# Altium schematic symbol library FPGA_Xilinx_Virtex7.SchLib: 34 symbols (part 24 of 26) (continued)
## XC7VX1140T-FLG1926 (continued)
part O pins: AA39 MGTHRXP0_215, AA40 MGTHRXN0_215, AA43 MGTHTXP1_215, AA44 MGTHTXN1_215, AB37 MGTREFCLK1P_215, AB38 MGTREFCLK1N_215, AB41 MGTHTXP0_215, AB42 MGTHTXN0_215, M41 MGTHRXP3_216, M42 MGTHRXN3_216, N39 MGTHRXP2_216, N40 MGTHRXN2_216, N43 MGTHTXP3_216, N44 MGTHTXN3_216, P37 MGTREFCLK0P_216, P38 MGTREFCLK0N_216, P41 MGTHTXP2_216, P42 MGTHTXN2_216, R39 MGTHRXP1_216, R40 MGTHRXN1_216, R43 MGTHTXP1_216, R44 MGTHTXN1_216, T37 MGTREFCLK1P_216, T38 MGTREFCLK1N_216, T41 MGTHRXP0_216, T42 MGTHRXN0_216, U39 MGTHRXP3_215, U40 MGTHRXN3_215, U43 MGTHTXP0_216, U44 MGTHTXN0_216, V37 MGTREFCLK0P_215, V38 MGTREFCLK0N_215, V41 MGTHTXP3_215, V42 MGTHTXN3_215, W39 MGTHRXP2_215, W40 MGTHRXN2_215, W43 MGTHTXP2_215, W44 MGTHTXN2_215, Y41 MGTHRXP1_215, Y42 MGTHRXN1_215
part P pins: A39 MGTHRXP3_218, A40 MGTHRXN3_218, B41 MGTHTXP3_218, B42 MGTHTXN3_218, C39 MGTHRXP2_218, C40 MGTHRXN2_218, C43 MGTHTXP2_218, C44 MGTHTXN2_218, D37 MGTREFCLK0P_218, D38 MGTREFCLK0N_218, D41 MGTHRXP1_218, D42 MGTHRXN1_218, E39 MGTHRXP0_218, E40 MGTHRXN0_218, E43 MGTHTXP1_218, E44 MGTHTXN1_218, F37 MGTREFCLK1P_218, F38 MGTREFCLK1N_218, F41 MGTHTXP0_218, F42 MGTHTXN0_218, G39 MGTHRXP3_217, G40 MGTHRXN3_217, G43 MGTHTXP3_217, G44 MGTHTXN3_217, H41 MGTHRXP2_217, H42 MGTHRXN2_217, J39 MGTHRXP1_217, J40 MGTHRXN1_217, J43 MGTHTXP2_217, J44 MGTHTXN2_217, K37 MGTREFCLK0P_217, K38 MGTREFCLK0N_217, K41 MGTHTXP1_217, K42 MGTHTXN1_217, L39 MGTHRXP0_217, L40 MGTHRXN0_217, L43 MGTHTXP0_217, L44 MGTHTXN0_217, M37 MGTREFCLK1P_217, M38 MGTREFCLK1N_217
part Q pins: AA8 MGTAVCC_G11, AA37 MGTAVCC_G21, AB6 MGTAVCC_G11, AB39 MGTAVCC_G21, AC4 MGTAVTT_G11, AC41 MGTAVTT_G21, AD2 MGTAVTT_G11, AD43 MGTAVTT_G21, AE8 MGTAVCC_G11, AE37 MGTAVCC_G21, AF6 MGTAVCC_G11, AF39 MGTAVCC_G21, AG4 MGTAVTT_G11, AG41 MGTAVTT_G21, AH2 MGTAVTT_G11, AH43 MGTAVTT_G21, AJ8 MGTAVCC_G11, AJ37 MGTAVCC_G21, AK6 MGTAVCC_G11, AK39 MGTAVCC_G21, AL4 MGTAVTT_G11, AL41 MGTAVTT_G21, AM2 MGTAVTT_G11, AM7 MGTAVTTRCAL_112, AM8 MGTRREF_112, AM37 MGTRREF_212, AM38 MGTAVTTRCAL_212, AM43 MGTAVTT_G21, AN8 MGTVCCAUX_G10, AN37 MGTVCCAUX_G20, AP6 MGTAVCC_G10, AP39 MGTAVCC_G20, AR4 MGTAVTT_G10, AR8 MGTAVCC_G10, AR37 MGTAVCC_G20, AR41 MGTAVTT_G20, AT2 MGTAVTT_G10, AT43 MGTAVTT_G20, AV6 MGTAVCC_G10, AV39 MGTAVCC_G20, AW4 MGTAVTT_G10, AW8 MGTAVCC_G10, AW37 MGTAVCC_G20, AW41 MGTAVTT_G20, AY2 MGTAVTT_G10, AY43 MGTAVTT_G20, B6 MGTAVCC_G12, B39 MGTAVCC_G22, BB6 MGTAVCC_G10, BB39 MGTAVCC_G20, BC4 MGTAVTT_G10, BC41 MGTAVTT_G20, C4 MGTAVTT_G12, C41 MGTAVTT_G22, D2 MGTAVTT_G12, D43 MGTAVTT_G22, E8 MGTAVCC_G12, E37 MGTAVCC_G22, F6 MGTAVCC_G12, F39 MGTAVCC_G22, G4 MGTAVTT_G12, G41 MGTAVTT_G22, H2 MGTAVTT_G12, H7 MGTAVTTRCAL_118, H8 MGTRREF_118, H37 MGTRREF_218, H38 MGTAVTTRCAL_218, H43 MGTAVTT_G22, J8 MGTAVCC_G12, J37 MGTAVCC_G22, K6 MGTAVCC_G12, K39 MGTAVCC_G22, L4 MGTAVTT_G12, L41 MGTAVTT_G22, M2 MGTAVTT_G12, M43 MGTAVTT_G22, N8 MGTAVCC_G12, N37 MGTAVCC_G22, P6 MGTAVCC_G12, P39 MGTAVCC_G22, R4 MGTAVTT_G12, R41 MGTAVTT_G22, T2 MGTAVTT_G12, T43 MGTAVTT_G22, U8 MGTVCCAUX_G12, U37 MGTVCCAUX_G22, V6 MGTAVCC_G11, V39 MGTAVCC_G21, W4 MGTAVTT_G11, W8 MGTVCCAUX_G11, W37 MGTVCCAUX_G21, W41 MGTAVTT_G21, Y2 MGTAVTT_G11, Y7 MGTAVTTRCAL_115, Y8 MGTRREF_115, Y37 MGTRREF_215, Y38 MGTAVTTRCAL_215, Y43 MGTAVTT_G21
part R pins: AA10 CFGBVS_0, AA35 TDO_0, AB11 M1_0, AB22 VREFN_0, AB23 VP_0, AC10 M0_0, AC22 VN_0, AC23 VREFP_0, AC35 TCK_0, AD11 M2_0, AD22 DXN_0, AD23 DXP_0, AD35 VCCO_0, AE10 DONE_0, AE35 TDI_0, AF35 VCCO_0, AG35 TMS_0, W10 INIT_B_0, W35 CCLK_0, Y11 PROGRAM_B_0
part S pins: A3 GND, A4 GND, A7 GND, A12 GND, A22 GND, A32 GND, A38 GND, A41 GND, A42 GND, AA11 VCCINT, AA13 VCCINT, AA15 VCCINT, AA17 VCCAUX, AA19 VCCINT, AA21 VCCINT, AA22 GNDADC, AA23 VCCADC, AA25 VCCAUX_IO_G1, AA27 VCCAUX, AA29 VCCINT, AA31 VCCINT, AA33 VCCINT, AB12 VCCINT, AB14 VCCINT, AB16 VCCINT, AB18 VCCAUX_IO_G4, AB20 VCCINT, AB24 VCCBRAM, AB26 VCCAUX_IO_G1, AB28 VCCINT, AB30 VCCINT, AB32 VCCINT, AB34 VCCINT, AC11 VCCINT, AC13 VCCINT, AC15 VCCINT, AC17 VCCAUX, AC19 VCCINT, AC21 VCCINT, AC25 VCCAUX_IO_G1, AC27 VCCAUX, AC29 VCCINT, AC31 VCCINT, AC33 VCCINT, AD12 VCCINT, AD14 VCCINT, AD16 VCCINT, AD18 VCCAUX_IO_G4, AD20 VCCINT, AD24 VCCBRAM, AD26 VCCAUX_IO_G0, AD28 VCCINT, AD30 VCCINT, AD32 VCCINT, AD34 VCCINT, AE11 VCCINT, AE13 VCCINT, AE15 VCCINT, AE17 VCCAUX, AE19 VCCAUX_IO_G3, AE21 VCCINT, AE23 VCCBRAM, AE25 VCCAUX_IO_G0, AE27 VCCAUX, AE29 VCCINT, AE31 VCCINT, AE33 VCCINT, AF12 VCCINT, AF14 VCCINT, AF16 VCCINT, AF18 VCCAUX_IO_G3, AF20 VCCINT, AF22 VCCINT, AF24 VCCBRAM, AF26 VCCAUX_IO_G0, AF28 VCCINT, AF30 VCCINT, AF32 VCCINT, AF34 VCCINT, AG11 VCCINT, AG13 VCCINT, AG15 VCCINT, AG17 VCCAUX, AG19 VCCAUX_IO_G3, AG21 VCCINT, AG23 VCCINT, AG25 VCCBRAM, AG27 VCCAUX, AG29 VCCINT, AG31 VCCINT, AG33 VCCINT, AH14 VCCINT, AH20 VCCINT, AH22 VCCINT, AH24 VCCBRAM, AH32 VCCINT, AH34 VCCINT, B2 GND, B5 GND, B7 GND, B9 GND, B19 GND, B29 GND, B38 GND, B40 GND, B43 GND, C3 GND, C7 GND, C8 GND, C9 GND, C16 GND, C26 GND, C36 GND, C37 GND, C38 GND, C42 GND, D1 GND, D5 GND, D6 GND, D9 GND, D13 GND, D23 GND, D33 GND, D36 GND, D39 GND, D40 GND, D44 GND, E3 GND, E4 GND, E7 GND, E9 GND, E10 GND, E20 GND, E30 GND, E36 GND, E38 GND, E41 GND, E42 GND, F1 GND, F2 GND, F5 GND, F9 GND, F17 GND, F27 GND, F36 GND, F40 GND, F43 GND, F44 GND, G3 GND, G7 GND, G8 GND, G9 GND, G14 GND, G24 GND, G34 GND, G36 GND, G37 GND, G38 GND, G42 GND, H1 GND, H5 GND, H6 GND, H9 GND, H11 GND, H21 GND, H31 GND, H36 GND, H39 GND, H40 GND, H44 GND, J3 GND, J4 GND, J7 GND, J9 GND, J18 GND, J28 GND, J36 GND, J38 GND, J41 GND, J42 GND, K1 GND, K2 GND, K5 GND, K9 GND, K15 GND, K25 GND, K35 GND, K36 GND, U35 VCCBATT_0, V12 VCCINT, V14 VCCINT, V24 VCCBRAM, V26 VCCAUX_IO_G2, V34 VCCINT, W11 VCCINT, W13 VCCINT, W15 VCCINT, W17 VCCAUX, W19 VCCAUX_IO_G5, W21 VCCINT, W23 VCCBRAM, W25 VCCBRAM, W27 VCCAUX, W29 VCCINT, W31 VCCINT, W33 VCCINT, Y12 VCCINT, Y14 VCCINT, Y16 VCCINT, Y18 VCCAUX_IO_G4, Y20 VCCINT, Y22 VCCINT, Y24 VCCBRAM, Y26 VCCAUX_IO_G2, Y28 VCCINT, Y30 VCCINT, Y32 VCCINT, Y34 VCCINT
part T pins: AA3 GND, AA4 GND, AA7 GND, AA9 GND, AA12 GND, AA14 GND, AA16 GND, AA18 GND, AA20 GND, AA24 GND, AA26 GND, AA28 GND, AA30 GND, AA32 GND, AA34 GND, AA36 GND, AA38 GND, AA41 GND, AA42 GND, AB1 GND, AB2 GND, AB5 GND, AB9 GND, AB10 GND, AB13 GND, AB15 GND, AB17 GND, AB19 GND, AB21 GND, AB25 GND, AB27 GND, AB29 GND, AB31 GND, AB33 GND, AB35 GND, AB36 GND, AB40 GND, AB43 GND, AB44 GND, AC3 GND, AC7 GND, AC8 GND, AC9 GND, AC12 GND, AC14 GND, AC16 GND, AC18 GND, AC20 GND, AC24 GND, AC26 GND, AC28 GND, AC30 GND, AC32 GND, AC34 GND, AC36 GND, AC37 GND, AC38 GND, AC42 GND, AD1 GND, AD5 GND, AD6 GND, AD9 GND, AD10 GND, AD13 GND, AD15 GND, AD17 GND, AD19 GND, AD21 GND, AD25 GND, AD27 GND, AD29 GND, AD31 GND, AD33 GND, AD36 GND, AD39 GND, AD40 GND, AD44 GND, AE3 GND, AE4 GND, AE7 GND, AE9 GND, AE12 GND, AE14 GND, AE16 GND, AE18 GND, AE20 GND, AE22 GND, AE24 GND, AE26 GND, AE28 GND, AE30 GND, AE32 GND, AE34 GND, AE36 GND, AE38 GND, AE41 GND, AE42 GND, AF1 GND, AF2 GND, AF5 GND, AF9 GND, AF10 GND, AF11 GND, AF13 GND, AF15 GND, AF17 GND, AF19 GND, AF21 GND, AF23 GND, AF25 GND, AF27 GND, AF29 GND, AF31 GND, AF33 GND, AF36 GND, AF40 GND, AF43 GND, AF44 GND, AG3 GND, AG7 GND, AG8 GND, AG9 GND, AG10 GND, AG12 GND, AG14 GND, AG16 GND, AG18 GND, AG20 GND, AG22 GND, AG24 GND, AG26 GND, AG28 GND, AG30 GND, AG32 GND, AG34 GND, AG36 GND, AG37 GND, AG38 GND, AG42 GND, AH1 GND, AH5 GND, AH6 GND, AH9 GND, AH11 GND, AH13 GND, AH15 GND, AH19 GND, AH21 GND, AH23 GND, AH25 GND, AH31 GND, AH33 GND, AH35 GND, AH36 GND, AH39 GND, AH40 GND, AH44 GND, AJ3 GND, AJ4 GND, AJ7 GND, AJ9 GND, AJ18 GND, AJ28 GND, AJ36 GND, AJ38 GND, AJ41 GND, AJ42 GND, AK1 GND, AK2 GND, K40 GND, K43 GND, K44 GND, L3 GND, L7 GND, L8 GND, L9 GND, L12 GND, L22 GND, L32 GND, L36 GND, L37 GND, L38 GND, L42 GND, M1 GND, M5 GND, M6 GND, M9 GND, M19 GND, M29 GND, M36 GND, M39 GND, M40 GND, M44 GND, N3 GND, N4 GND, N7 GND, N9 GND, N16 GND, N26 GND, N36 GND, N38 GND, N41 GND, N42 GND, P1 GND, P2 GND, P5 GND, P9 GND, P13 GND, P23 GND, P33 GND, P36 GND, P40 GND, P43 GND, P44 GND, R3 GND, R7 GND, R8 GND, R9 GND, R10 GND, R20 GND, R30 GND, R36 GND, R37 GND, R38 GND, R42 GND, T1 GND, T5 GND, T6 GND, T9 GND, T17 GND, T27 GND, T34 GND, T35 GND, T36 GND, T39 GND, T40 GND, T44 GND, U3 GND, U4 GND, U7 GND, U9 GND, U14 GND, U24 GND, U34 GND, U36 GND, U38 GND, U41 GND, U42 GND, V1 GND, V2 GND, V5 GND, V9 GND, V10 GND, V11 GND, V21 GND, V23 GND, V25 GND, V31 GND, V35 GND, V36 GND, V40 GND, V43 GND, V44 GND, W3 GND, W7 GND, W9 GND, W12 GND, W14 GND, W16 GND, W18 GND, W20 GND, W22 GND, W24 GND, W26 GND, W28 GND, W30 GND, W32 GND, W34 GND, W36 GND, W38 GND, W42 GND, Y1 GND, Y5 GND, Y6 GND, Y9 GND, Y10 GND, Y13 GND, Y15 GND, Y17 GND, Y19 GND, Y21 GND, Y23 GND, Y25 GND, Y27 GND, Y29 GND, Y31 GND, Y33 GND, Y35 GND, Y36 GND, Y39 GND, Y40 GND, Y44 GND
part U pins: AK5 GND, AK9 GND, AK15 GND, AK25 GND, AK35 GND, AK36 GND, AK40 GND, AK43 GND, AK44 GND, AL3 GND, AL7 GND, AL8 GND, AL9 GND, AL12 GND, AL22 GND, AL32 GND, AL36 GND, AL37 GND, AL38 GND, AL42 GND, AM1 GND, AM5 GND, AM6 GND, AM9 GND, AM19 GND, AM29 GND, AM36 GND, AM39 GND, AM40 GND, AM44 GND, AN3 GND, AN4 GND, AN7 GND, AN9 GND, AN16 GND, AN26 GND, AN36 GND, AN38 GND, AN41 GND, AN42 GND, AP1 GND, AP2 GND, AP5 GND, AP9 GND, AP13 GND, AP23 GND, AP33 GND, AP36 GND, AP40 GND, AP43 GND, AP44 GND, AR3 GND, AR7 GND, AR9 GND, AR10 GND, AR20 GND, AR30 GND, AR36 GND, AR38 GND, AR42 GND, AT1 GND, AT5 GND, AT6 GND, AT9 GND, AT17 GND, AT27 GND, AT36 GND, AT39 GND, AT40 GND, AT44 GND, AU3 GND, AU4 GND, AU7 GND, AU8 GND, AU9 GND, AU14 GND, AU24 GND, AU34 GND, AU36 GND, AU37 GND, AU38 GND, AU41 GND, AU42 GND, AV1 GND, AV2 GND, AV5 GND, AV9 GND, AV11 GND, AV21 GND, AV31 GND, AV36 GND, AV40 GND, AV43 GND, AV44 GND, AW3 GND, AW7 GND, AW9 GND, AW18 GND, AW28 GND, AW36 GND, AW38 GND, AW42 GND, AY1 GND, AY5 GND, AY6 GND, AY9 GND, AY15 GND, AY25 GND, AY35 GND, AY36 GND, AY39 GND, AY40 GND, AY44 GND, BA3 GND, BA4 GND, BA7 GND, BA8 GND, BA9 GND, BA12 GND, BA22 GND, BA32 GND, BA36 GND, BA37 GND, BA38 GND, BA41 GND, BA42 GND, BB1 GND, BB2 GND, BB5 GND, BB7 GND, BB9 GND, BB19 GND, BB29 GND, BB38 GND, BB40 GND, BB43 GND, BB44 GND, BC2 GND, BC3 GND, BC7 GND, BC16 GND, BC26 GND, BC36 GND, BC38 GND, BC42 GND, BC43 GND, BD5 GND, BD6 GND, BD7 GND, BD13 GND, BD23 GND, BD33 GND, BD38 GND, BD39 GND, BD40 GND

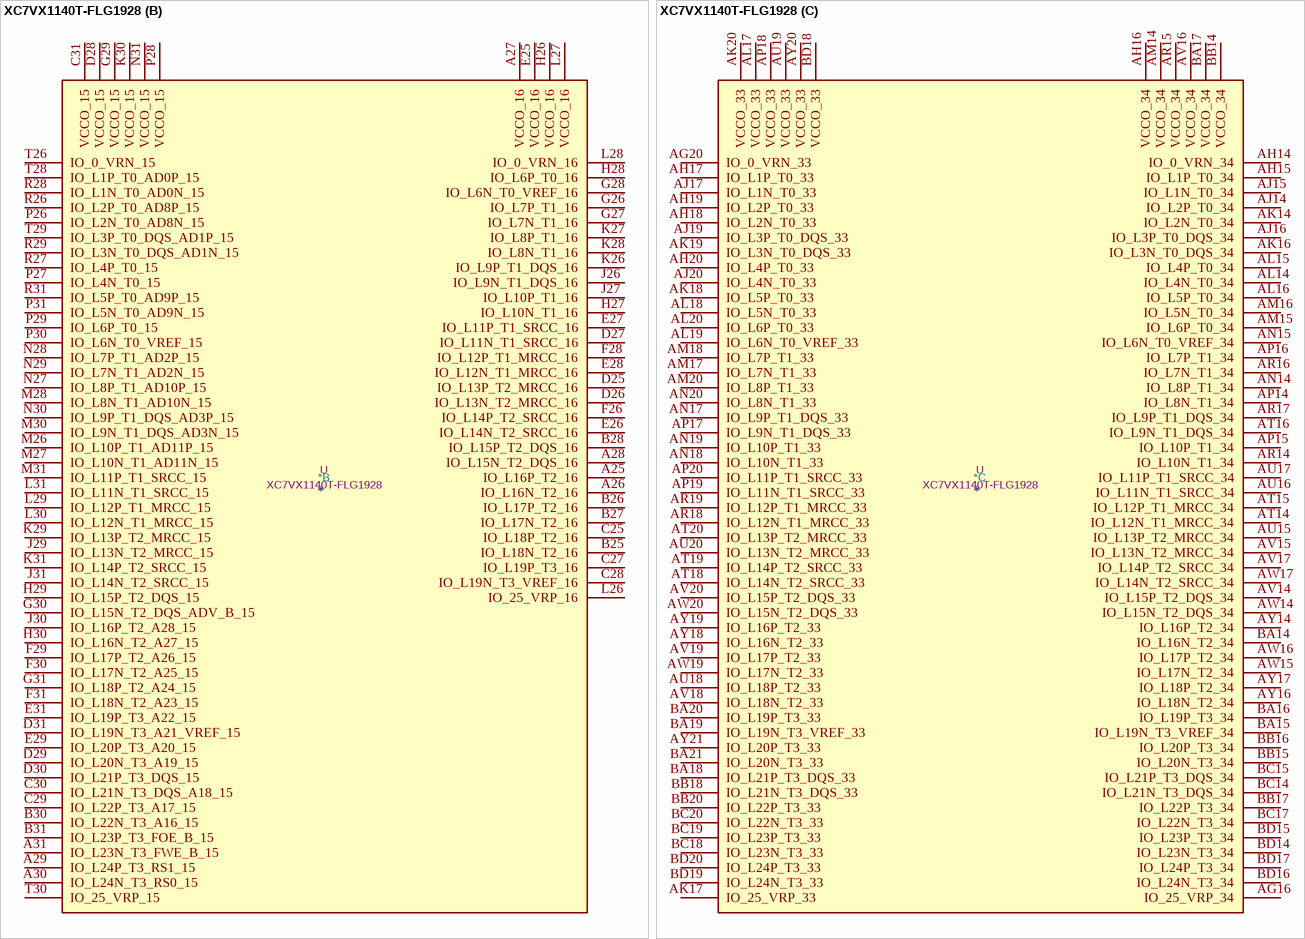
[diagram p162: symbol XC7VX1140T-FLG1928]

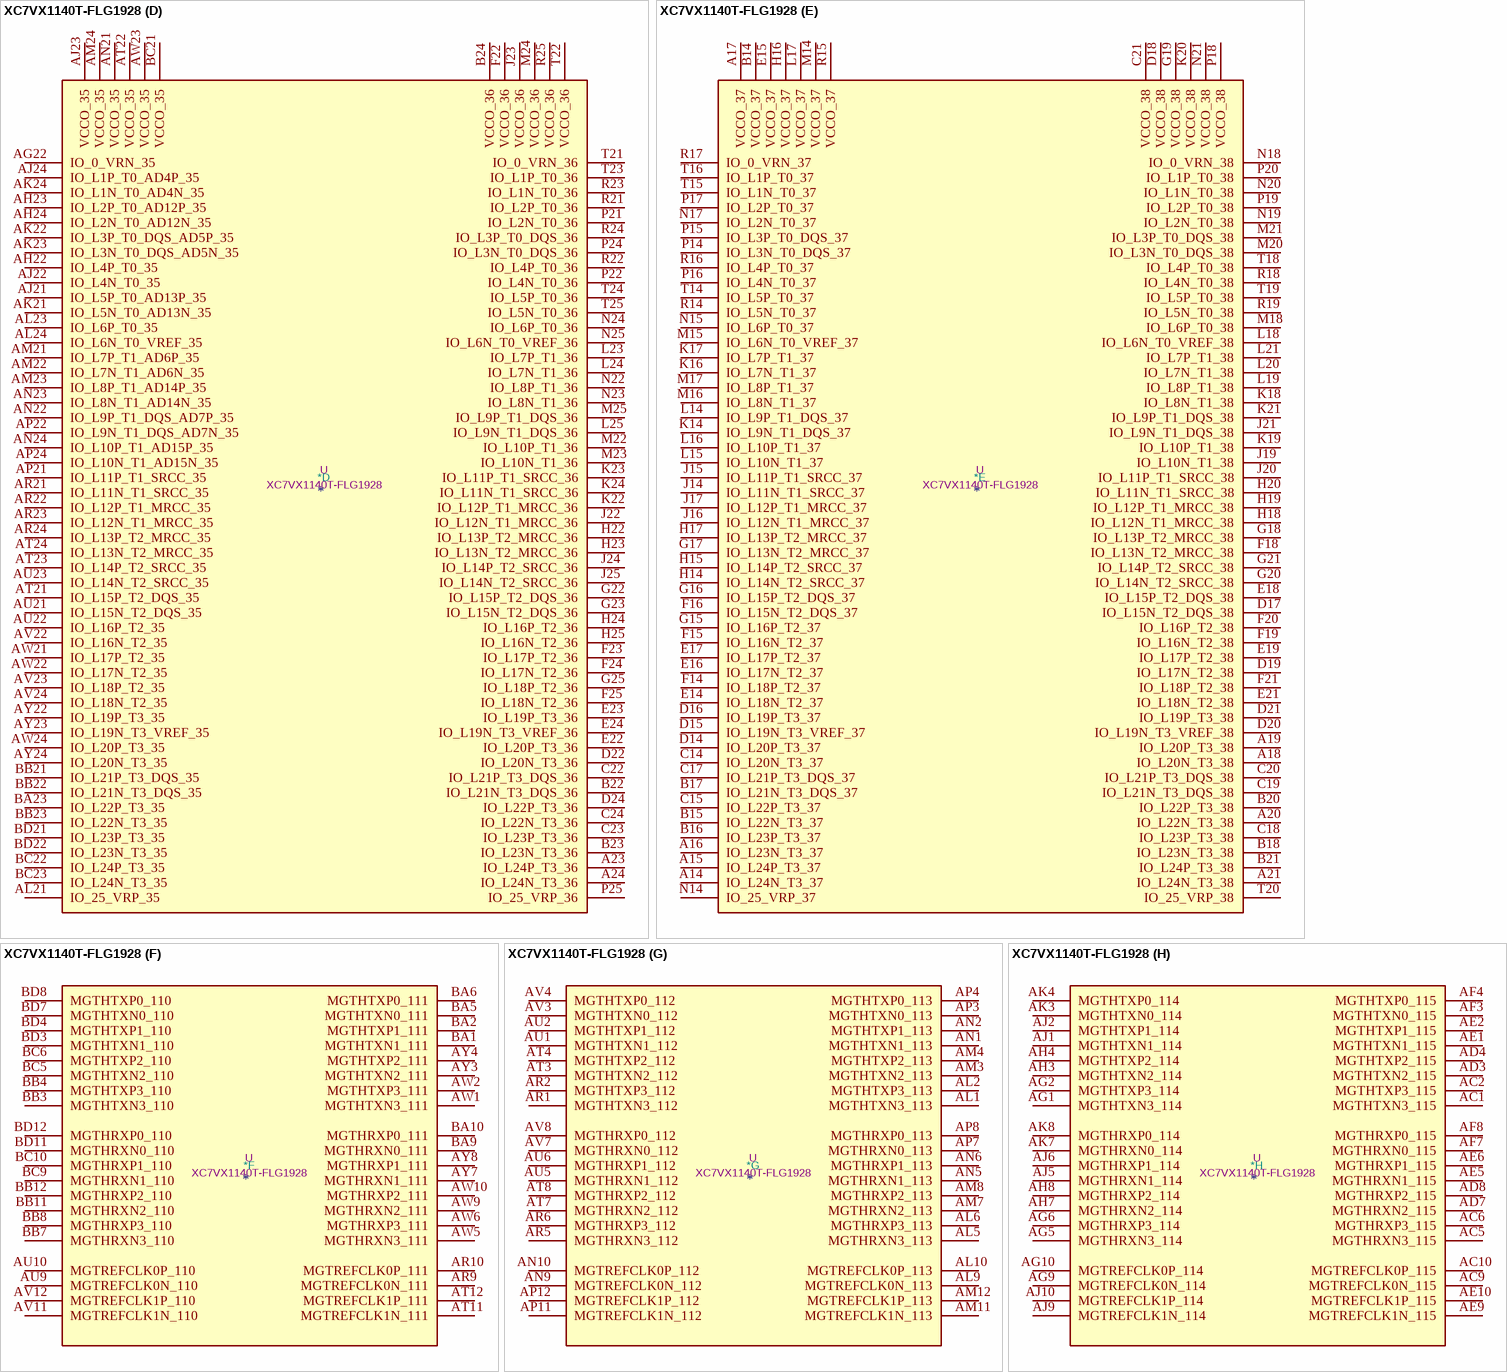
[diagram p163: symbol XC7VX1140T-FLG1928]

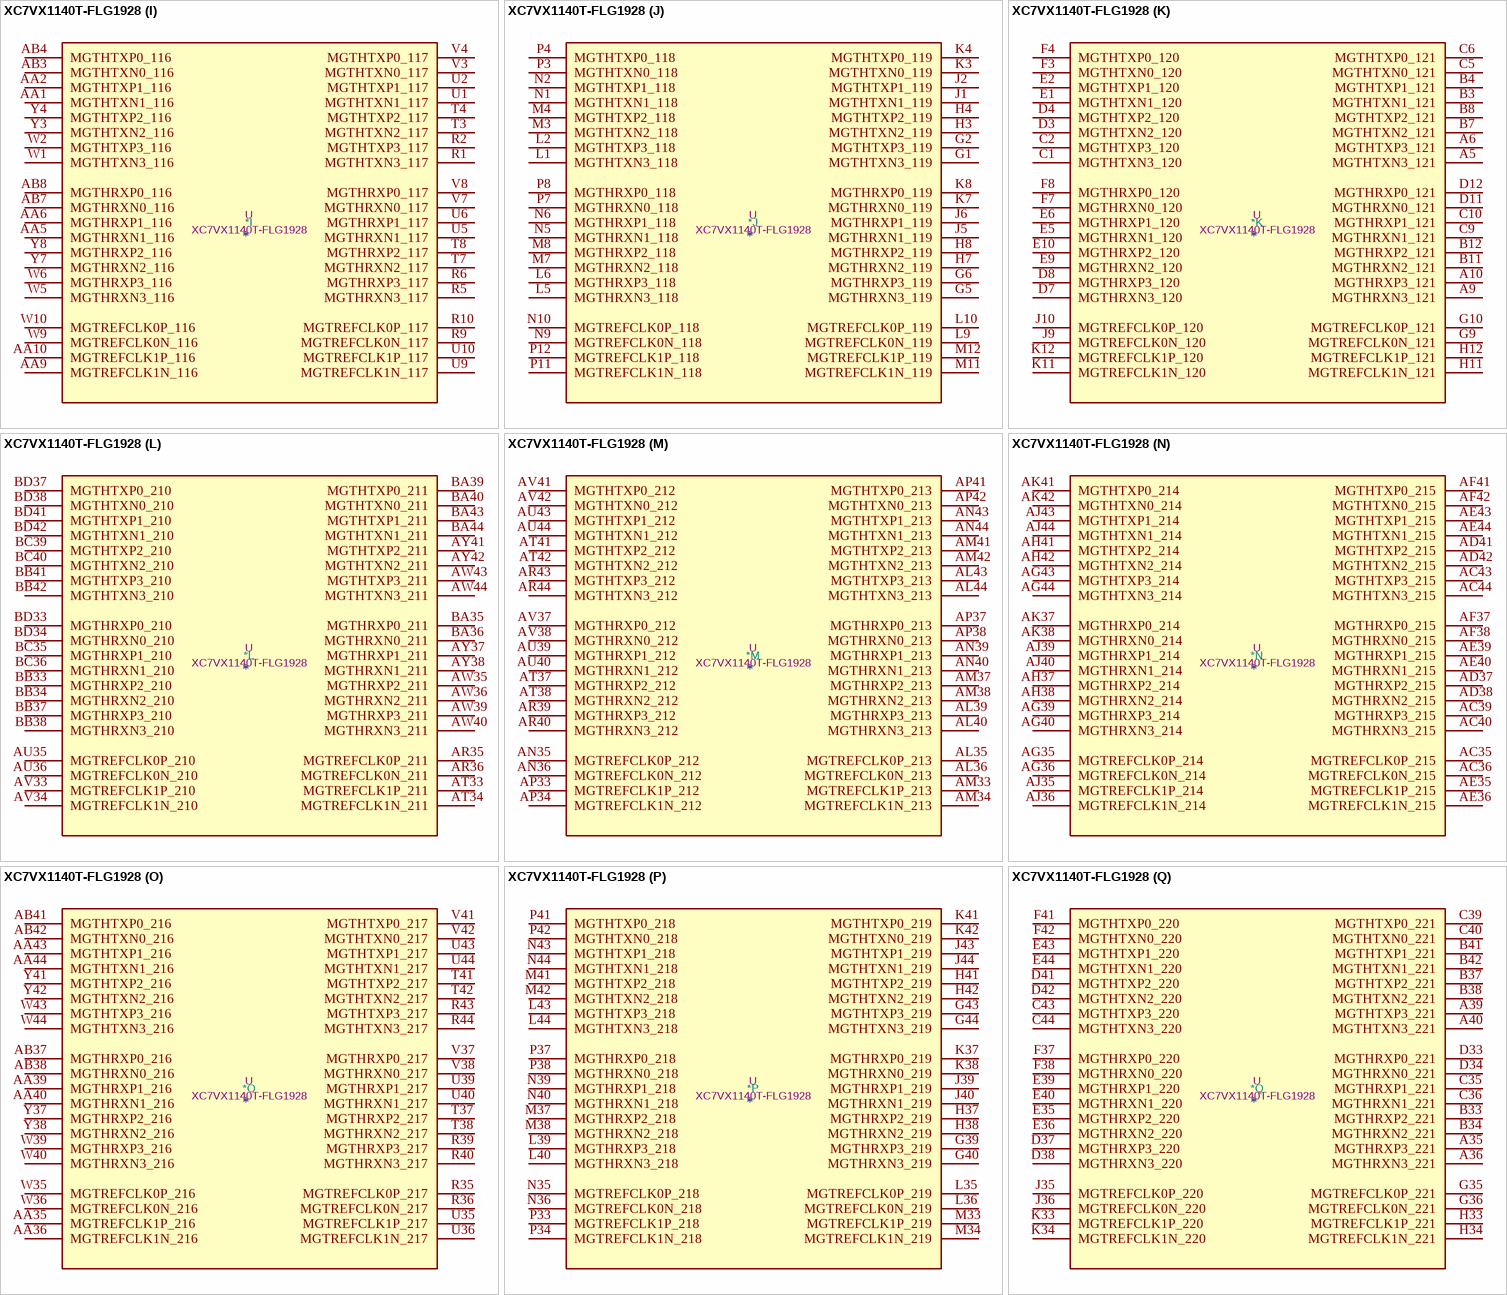
[diagram p164: symbol XC7VX1140T-FLG1928]

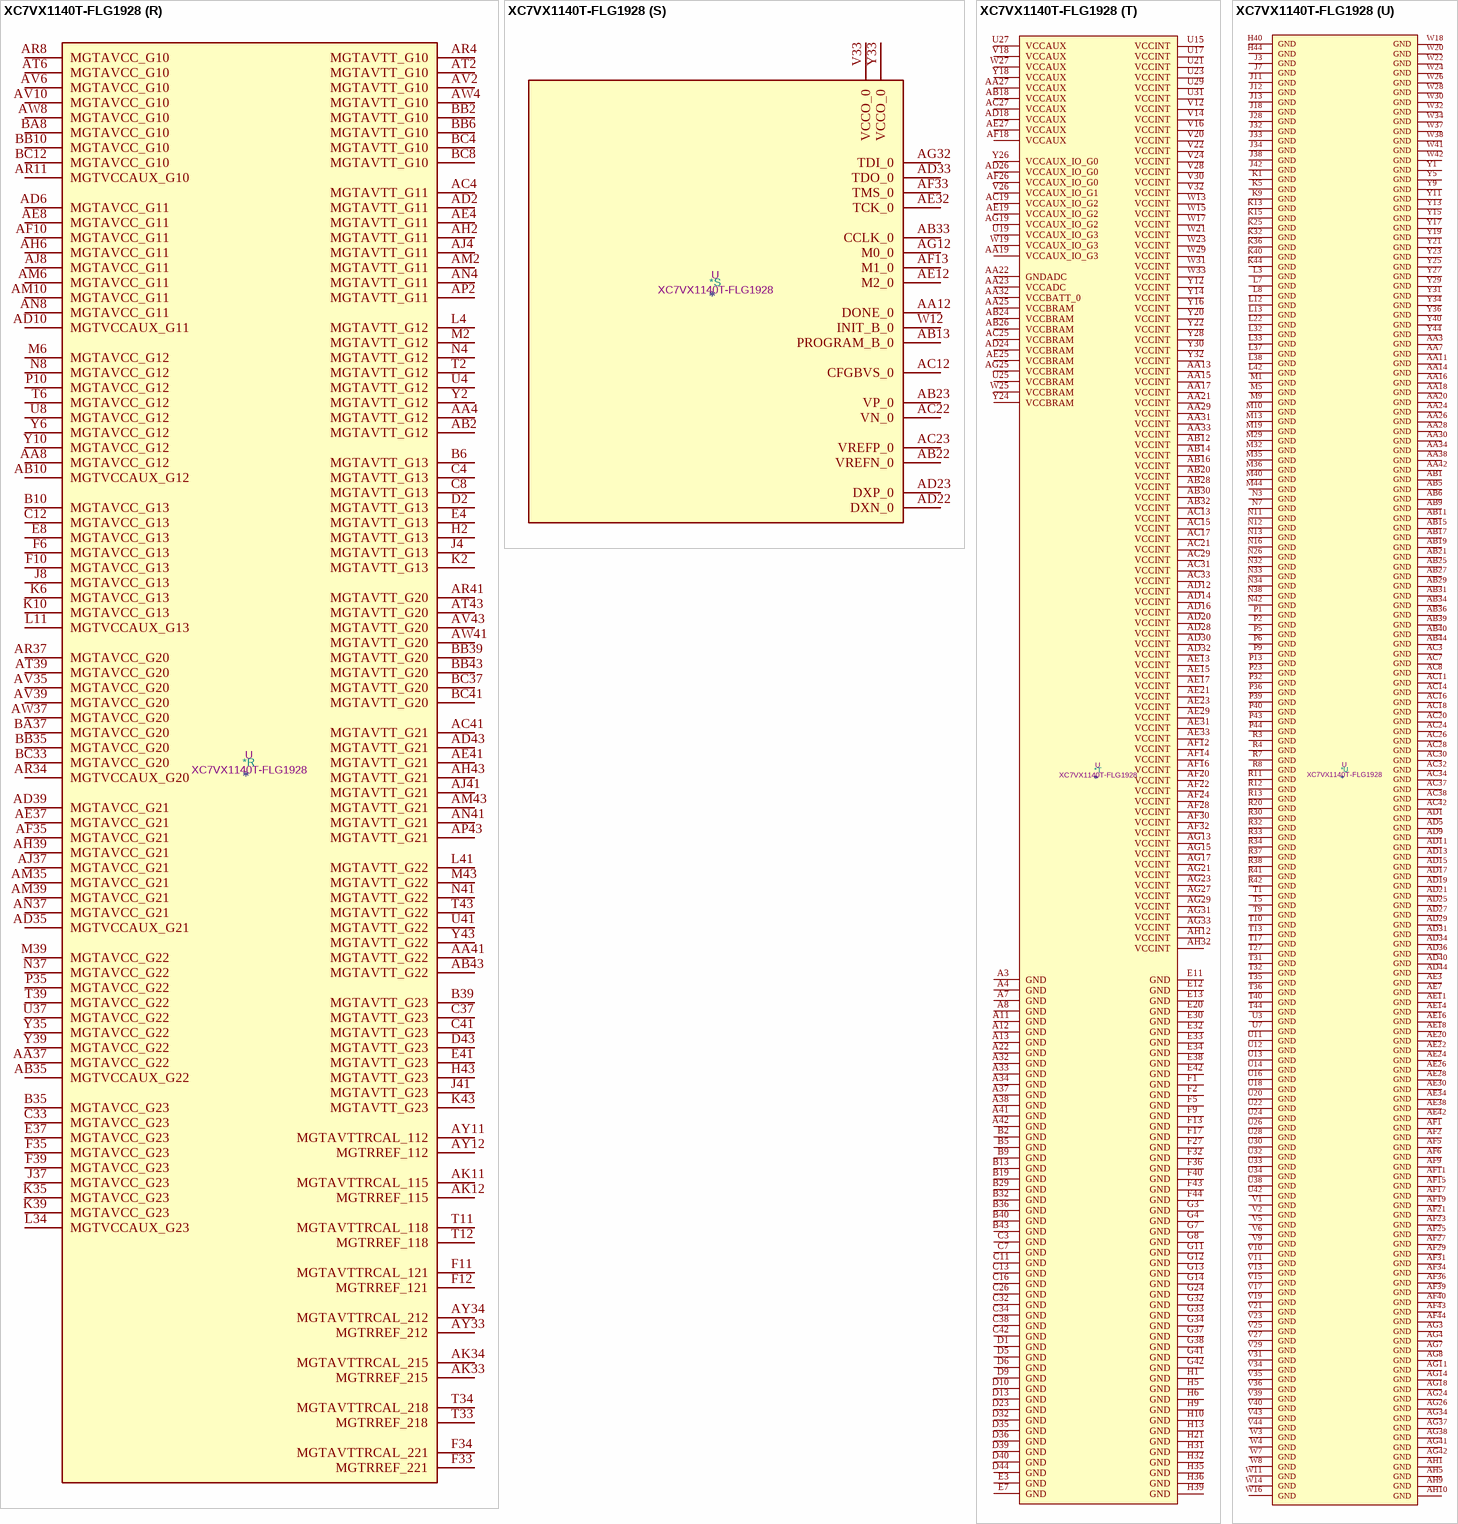
[diagram p165: symbol XC7VX1140T-FLG1928]

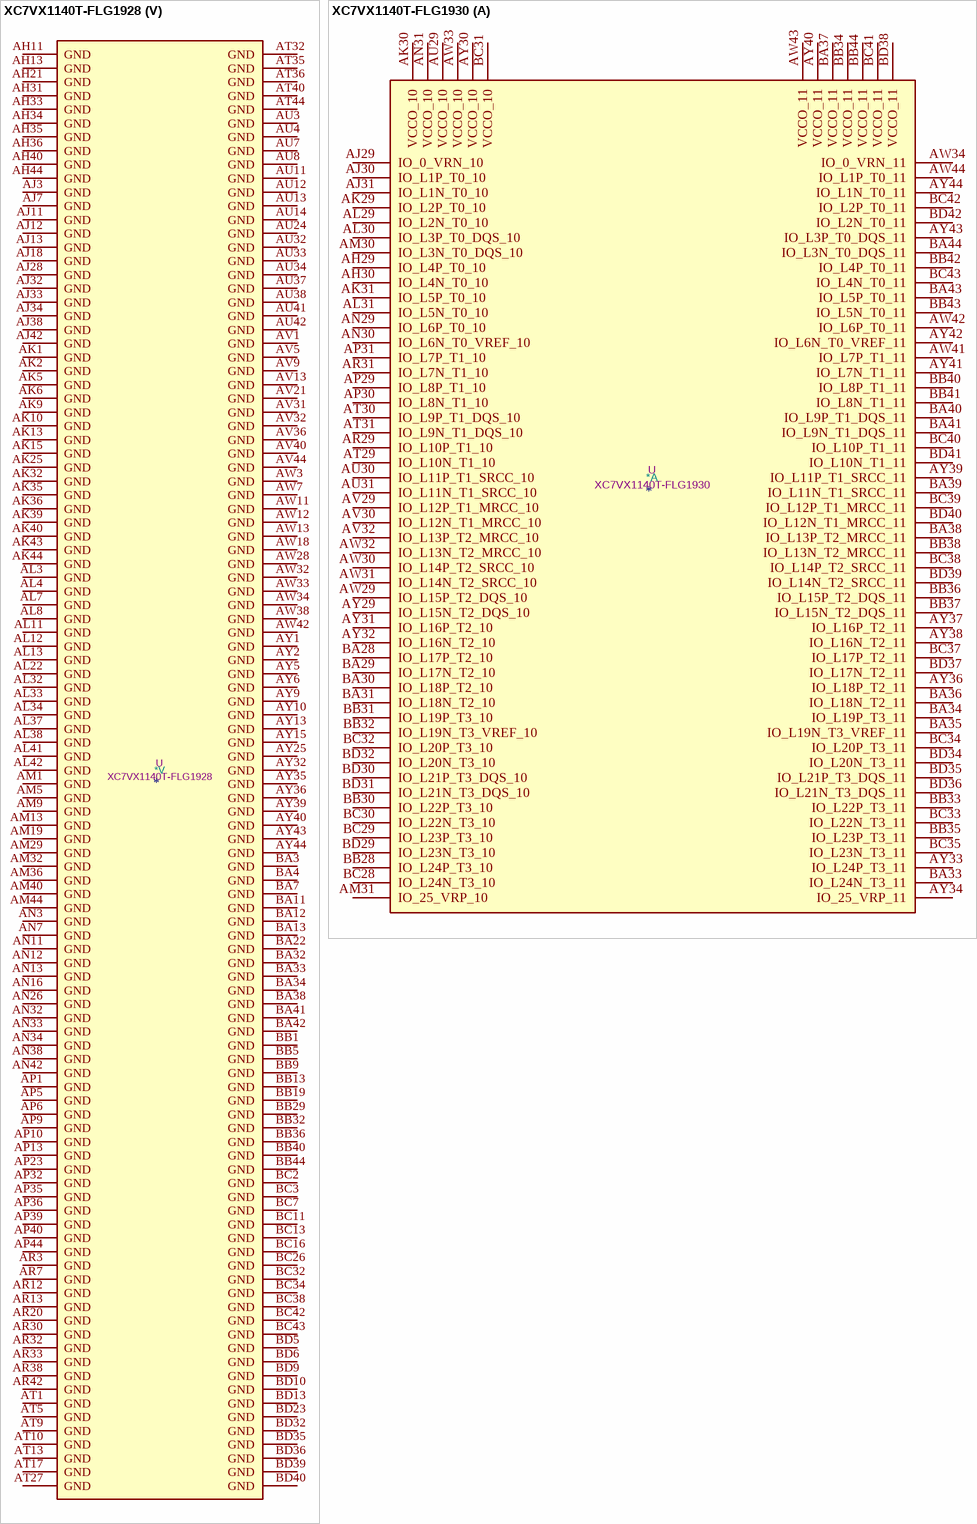
[diagram p166: symbols XC7VX1140T-FLG1928 to XC7VX1140T-FLG1930]